# Altium footprint library Modules.PcbLib: 18 footprints (part 1 of 2)
Each footprint in its own frame and in the unit in brackets; x right, y up, seen from the top. Pads: shape width x height; smd on the part's side, far side on the other; paste and mask are expansions set on the pad; w line width, h text height; cw(c..) or ccw(c..) is an arc to the next point about the centre after c.
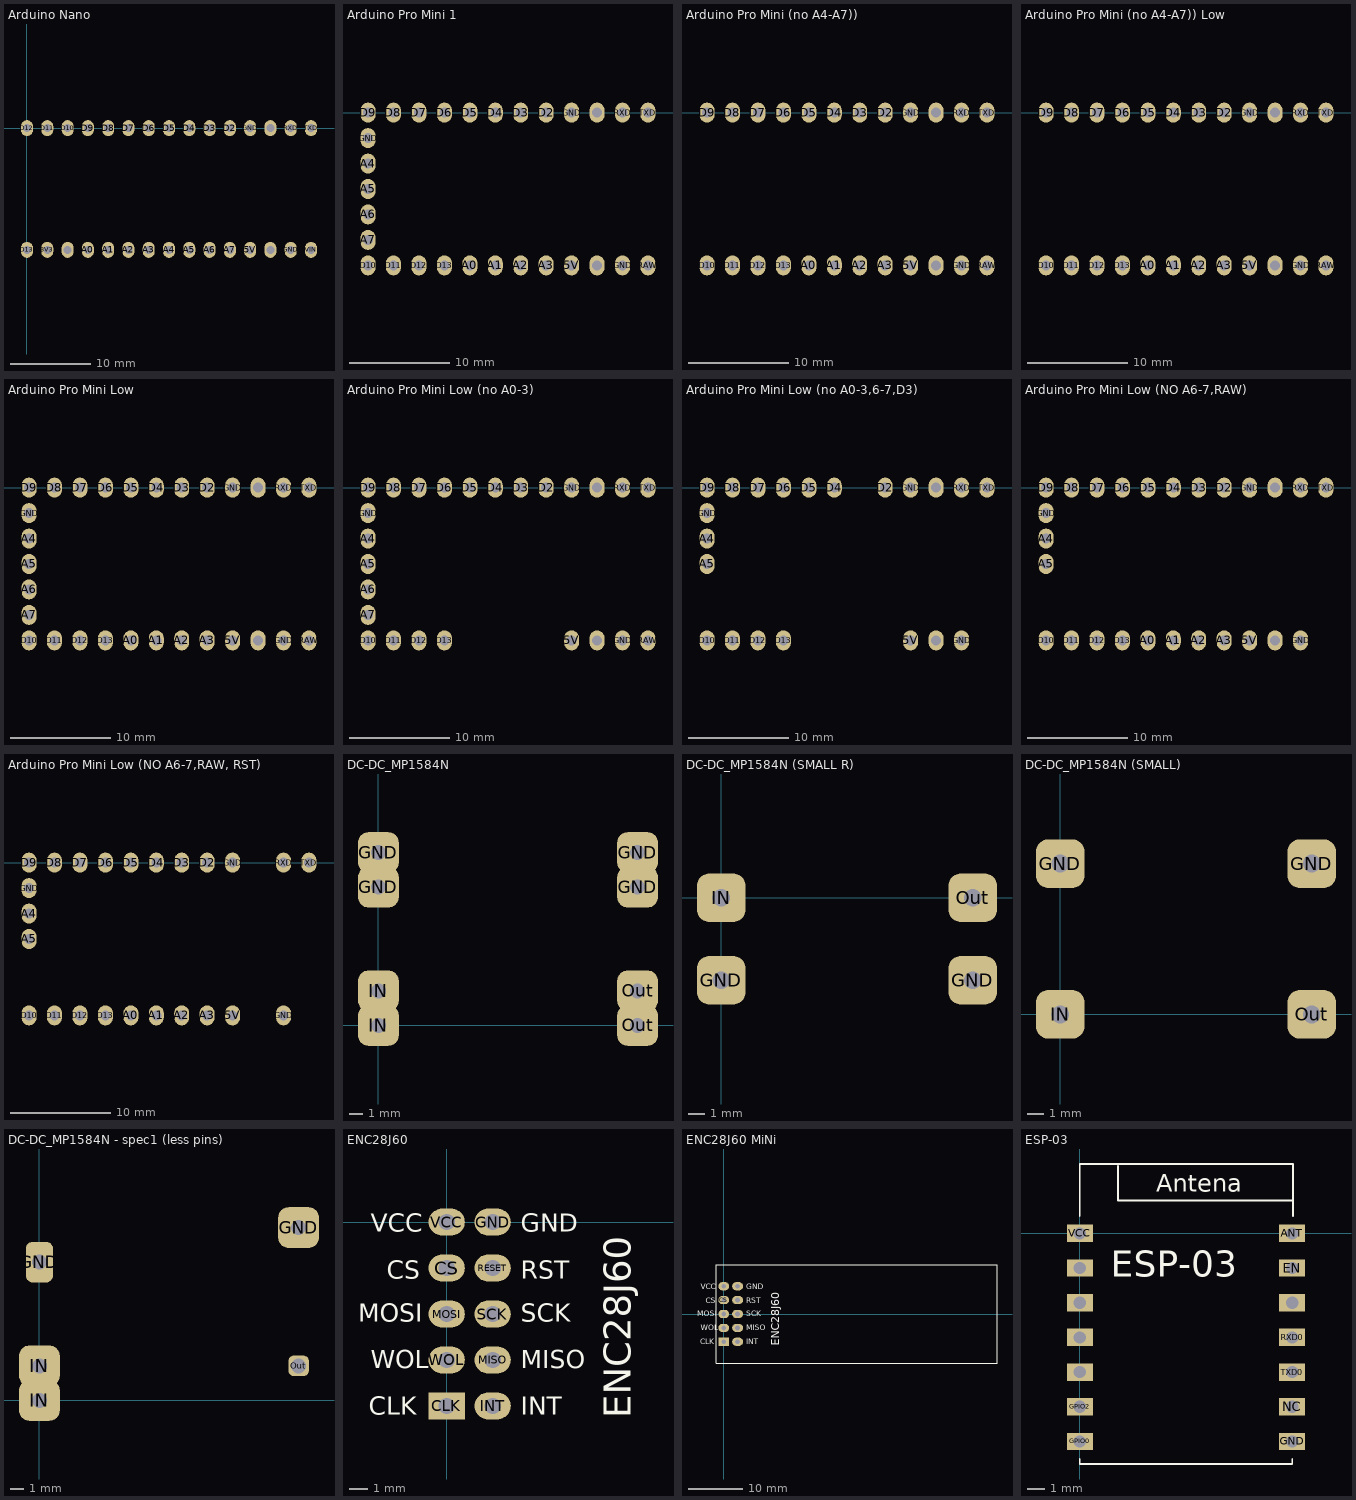
[diagram p0: the footprints below, top view; thin cyan lines are the x and y axes]

## Arduino Nano [mm]
pads (30):
  oval 1.5x2 hole 1: 3V3(2.54,-15.24) 5V(27.94,-15.24) A0(7.62,-15.24) A1(10.16,-15.24) A2(12.7,-15.24) A3(15.24,-15.24) A4(17.78,-15.24) A5(20.32,-15.24) A6(22.86,-15.24) A7(25.4,-15.24) AREF(5.08,-15.24) D2(25.4,0) D3(22.86,0) D4(20.32,0) D5(17.78,0) D6(15.24,0) D7(12.7,0) D8(10.16,0) D9(7.62,0) D10(5.08,0) D11(2.54,0) D12(0,0) D13(0,-15.24) GND(27.94,0) GND(33.02,-15.24) Reset(30.48,-15.24) Reset(30.48,0) RXD(33.02,0) TXD(35.56,0) VIN(35.56,-15.24)
3D body "Arduino Nano v3.STEP": height 21.18, standoff 2.62, extent -5.515,-16.53 39.405,1.26
3D body "PBS-10.step": height 8.4, standoff -3.2, extent -1.27,-1.27 24.13,1.27
3D body "PBS-10.step": height 8.4, standoff -3.2, extent -1.27,-16.51 24.13,-13.97
3D body "PBS-05.step": height 8.4, standoff -3.2, extent 24.13,-1.27 36.83,1.27
3D body "PBS-05.step": height 8.4, standoff -3.2, extent 24.13,-16.51 36.83,-13.97

## Arduino Pro Mini 1 [mm]
pads (29):
  oval 1.5x2 hole 1: 5V(27.94,-15.24) A0(17.78,-15.24) A1(20.32,-15.24) A2(22.86,-15.24) A3(25.4,-15.24) A4(7.62,-5.08) A5(7.62,-7.62) A6(7.62,-10.16) A7(7.62,-12.7) D2(25.4,0) D3(22.86,0) D4(20.32,0) D5(17.78,0) D6(15.24,0) D7(12.7,0) D8(10.16,0) D9(7.62,0) D10(7.62,-15.24) D11(10.16,-15.24) D12(12.7,-15.24) D13(15.24,-15.24) GND(7.62,-2.54) GND(27.94,0) GND(33.02,-15.24) RAW(35.56,-15.24) Reset(30.48,-15.24) Reset(30.48,0) RXD(33.02,0) TXD(35.56,0)
3D body "ARDUINO Pro MINI V1.STEP": height 20.8, standoff 2.2, extent 5.625,-16.925 39.625,1.675
3D body "PBS-12.step": height 8.4, standoff -3.2, extent 6.35,-1.27 36.83,1.27
3D body "PBS-12.step": height 8.4, standoff -3.2, extent 6.35,-16.51 36.83,-13.97
3D body "PBS-05.step": height 8.4, standoff -3.2, extent 6.35,-13.97 8.89,-1.27

## Arduino Pro Mini (no A4-A7)) [mm]
pads (24):
  oval 1.5x2 hole 1: 5V(27.94,-15.24) A0(17.78,-15.24) A1(20.32,-15.24) A2(22.86,-15.24) A3(25.4,-15.24) D2(25.4,0) D3(22.86,0) D4(20.32,0) D5(17.78,0) D6(15.24,0) D7(12.7,0) D8(10.16,0) D9(7.62,0) D10(7.62,-15.24) D11(10.16,-15.24) D12(12.7,-15.24) D13(15.24,-15.24) GND(27.94,0) GND(33.02,-15.24) RAW(35.56,-15.24) Reset(30.48,-15.24) Reset(30.48,0) RXD(33.02,0) TXD(35.56,0)
3D body "ARDUINO Pro MINI V1.STEP": height 20.8, standoff 2.2, extent 5.625,-16.925 39.625,1.675
3D body "PBS-12.step": height 8.4, standoff -3.2, extent 6.35,-1.27 36.83,1.27
3D body "PBS-12.step": height 8.4, standoff -3.2, extent 6.35,-16.51 36.83,-13.97

## Arduino Pro Mini (no A4-A7)) Low [mm]
pads (24):
  oval 1.5x2 hole 1: 5V(27.94,-15.24) A0(17.78,-15.24) A1(20.32,-15.24) A2(22.86,-15.24) A3(25.4,-15.24) D2(25.4,0) D3(22.86,0) D4(20.32,0) D5(17.78,0) D6(15.24,0) D7(12.7,0) D8(10.16,0) D9(7.62,0) D10(7.62,-15.24) D11(10.16,-15.24) D12(12.7,-15.24) D13(15.24,-15.24) GND(27.94,0) GND(33.02,-15.24) RAW(35.56,-15.24) Reset(30.48,-15.24) Reset(30.48,0) RXD(33.02,0) TXD(35.56,0)
3D body "ARDUINO Pro MINI V1.STEP": height 12.5, standoff -6.1, extent 5.625,-16.925 39.625,1.675

## Arduino Pro Mini Low [mm]
pads (29):
  oval 1.5x2 hole 1: 5V(27.94,-15.24) A0(17.78,-15.24) A1(20.32,-15.24) A2(22.86,-15.24) A3(25.4,-15.24) A4(7.62,-5.08) A5(7.62,-7.62) A6(7.62,-10.16) A7(7.62,-12.7) D2(25.4,0) D3(22.86,0) D4(20.32,0) D5(17.78,0) D6(15.24,0) D7(12.7,0) D8(10.16,0) D9(7.62,0) D10(7.62,-15.24) D11(10.16,-15.24) D12(12.7,-15.24) D13(15.24,-15.24) GND(7.62,-2.54) GND(27.94,0) GND(33.02,-15.24) RAW(35.56,-15.24) Reset(30.48,-15.24) Reset(30.48,0) RXD(33.02,0) TXD(35.56,0)
3D body "ARDUINO Pro MINI V1.STEP": height 12.5, standoff -6.1, extent 5.625,-16.925 39.625,1.675

## Arduino Pro Mini Low (no A0-3) [mm]
pads (25):
  oval 1.5x2 hole 1: 5V(27.94,-15.24) A4(7.62,-5.08) A5(7.62,-7.62) A6(7.62,-10.16) A7(7.62,-12.7) D2(25.4,0) D3(22.86,0) D4(20.32,0) D5(17.78,0) D6(15.24,0) D7(12.7,0) D8(10.16,0) D9(7.62,0) D10(7.62,-15.24) D11(10.16,-15.24) D12(12.7,-15.24) D13(15.24,-15.24) GND(7.62,-2.54) GND(27.94,0) GND(33.02,-15.24) RAW(35.56,-15.24) Reset(30.48,-15.24) Reset(30.48,0) RXD(33.02,0) TXD(35.56,0)
3D body "ARDUINO Pro MINI V1.STEP": height 12.5, standoff -6.1, extent 5.625,-16.925 39.625,1.675

## Arduino Pro Mini Low (no A0-3,6-7,D3) [mm]
pads (21):
  oval 1.5x2 hole 1: 5V(27.94,-15.24) A4(7.62,-5.08) A5(7.62,-7.62) D2(25.4,0) D4(20.32,0) D5(17.78,0) D6(15.24,0) D7(12.7,0) D8(10.16,0) D9(7.62,0) D10(7.62,-15.24) D11(10.16,-15.24) D12(12.7,-15.24) D13(15.24,-15.24) GND(7.62,-2.54) GND(27.94,0) GND(33.02,-15.24) Reset(30.48,-15.24) Reset(30.48,0) RXD(33.02,0) TXD(35.56,0)
3D body "ARDUINO Pro MINI V1.STEP": height 12.5, standoff -6.1, extent 5.625,-16.925 39.625,1.675

## Arduino Pro Mini Low (NO A6-7,RAW) [mm]
pads (26):
  oval 1.5x2 hole 1: 5V(27.94,-15.24) A0(17.78,-15.24) A1(20.32,-15.24) A2(22.86,-15.24) A3(25.4,-15.24) A4(7.62,-5.08) A5(7.62,-7.62) D2(25.4,0) D3(22.86,0) D4(20.32,0) D5(17.78,0) D6(15.24,0) D7(12.7,0) D8(10.16,0) D9(7.62,0) D10(7.62,-15.24) D11(10.16,-15.24) D12(12.7,-15.24) D13(15.24,-15.24) GND(7.62,-2.54) GND(27.94,0) GND(33.02,-15.24) Reset(30.48,-15.24) Reset(30.48,0) RXD(33.02,0) TXD(35.56,0)
3D body "ARDUINO Pro MINI V1.STEP": height 12.5, standoff -6.1, extent 5.625,-16.925 39.625,1.675

## Arduino Pro Mini Low (NO A6-7,RAW, RST) [mm]
pads (24):
  oval 1.5x2 hole 1: 5V(27.94,-15.24) A0(17.78,-15.24) A1(20.32,-15.24) A2(22.86,-15.24) A3(25.4,-15.24) A4(7.62,-5.08) A5(7.62,-7.62) D2(25.4,0) D3(22.86,0) D4(20.32,0) D5(17.78,0) D6(15.24,0) D7(12.7,0) D8(10.16,0) D9(7.62,0) D10(7.62,-15.24) D11(10.16,-15.24) D12(12.7,-15.24) D13(15.24,-15.24) GND(7.62,-2.54) GND(27.94,0) GND(33.02,-15.24) RXD(33.02,0) TXD(35.56,0)
3D body "ARDUINO Pro MINI V1.STEP": height 12.5, standoff -6.1, extent 5.625,-16.925 39.625,1.675

## DC-DC_MP1584N [mm]
pads (8):
  rrect50% 3x3 hole 1.1: GND(0,10.16) GND(0,12.7) GND(19.05,10.16) GND(19.05,12.7) IN(0,0) IN(0,2.54) Out(19.05,0) Out(19.05,2.54)
3D body "Resistor Adjustable SMD noname.step": height 5, standoff 3.9, extent 11.476,0.775 14.375,2.975
3D body "DO-214AC.step": height 6.4, standoff 3.83, extent 3.35,10 8.85,12.8
3D body "Inductor_5.7x5.2x3mm_SMD.step": height 6.7, standoff 3.8, extent 10.1,5.35 16,10.55
3D body "1206 SMD Capacitor.step": height 4.8, standoff 3.8, extent -0.8,4.8 0.8,8
3D body "1206 SMD Capacitor.step": height 4.8, standoff 3.8, extent 18.2,4.7 19.8,7.9
3D body "SMD 0603 (1608).step": height 4.25, standoff 3.8, extent 2.65,5.2 3.5,6.75
3D body "SMD 0603 (1608).step": height 4.25, standoff 3.8, extent 2.6,3.05 3.45,4.6
3D body "SMD 0603 (1608).step": height 4.25, standoff 3.8, extent 7.05,0.45 8.6,1.3
3D body "SMD 0603 (1608).step": height 4.25, standoff 3.8, extent 3.75,0.45 5.3,1.3
3D body "SMD 0603 (1608).step": height 4.25, standoff 3.8, extent 7.05,1.85 8.6,2.7
3D body "SMD 0603 (1608).step": height 4.25, standoff 3.8, extent 3.75,1.85 5.3,2.7
3D body "SO8.step": height 5.4, standoff 3.8, extent 3.965,3.125 8.865,9.115
3D body: height 3.8, standoff 2.3, extent -1.27,-1.27 20.303,13.97
3D body "PLS-02.stp": height 5.5, standoff -5.7, extent 17.804,-1.17 20.303,3.91
3D body "PLS-02.stp": height 5.5, standoff -5.7, extent 17.804,8.99 20.303,14.07
3D body "PLS-02.stp": height 5.5, standoff -5.7, extent -1.246,8.99 1.253,14.07
3D body "PLS-02.stp": height 5.5, standoff -5.7, extent -1.246,-1.17 1.253,3.91

## DC-DC_MP1584N (SMALL R) [mm]
pads (4):
  rrect50% 3x3 hole 1.1: GND(0,-5.08) GND(15.5,-5.08) IN(0,0) Out(15.5,0)
3D body "PLS-01R.STEP": height 11.32, standoff 0.96, extent 14.2,-4.25 16.74,1.25
3D body "PLS-01R.STEP": height 11.32, standoff 0.96, extent -1.27,-4.25 1.27,1.25
3D body "PLS-01.step": height 5.7, standoff -5.9, extent 14.23,-6.35 16.77,-3.81
3D body "PLS-01.step": height 5.7, standoff -5.9, extent -1.27,-6.35 1.27,-3.81
3D body: height 11.8, standoff 0.3, extent -1.235,-4.4 16.835,-3
3D body "SO8.step": height 10.99, standoff 5, extent 2.95,-3 7.85,-1.4
3D body "SMD 0603 (1608).step": height 3.27, standoff 1.73, extent 7.85,-3.1 8.7,-2.649
3D body "SMD 0603 (1608).step": height 3.27, standoff 1.73, extent 6.55,-3 7.4,-2.549
3D body "SMD 0603 (1608).step": height 4.57, standoff 3.03, extent 1.95,-2.9 2.8,-2.449
3D body "SMD 0603 (1608).step": height 8.77, standoff 7.22, extent 1.85,-3.1 2.7,-2.649
3D body "SMD 0603 (1608).step": height 3.27, standoff 1.73, extent 5.15,-3 6,-2.549
3D body "SMD 0603 (1608).step": height 3.27, standoff 1.73, extent 3.75,-3.1 4.6,-2.649
3D body "1206 SMD Capacitor.step": height 7.6, standoff 4.4, extent 14.7,-3 16.3,-1.998
3D body "1206 SMD Capacitor.step": height 7.6, standoff 4.4, extent -0.2,-3 1.4,-1.998
3D body "Inductor_5.7x5.2x3mm_SMD.step": height 11.1, standoff 5.2, extent 8.5,-3 13.7,-0.1
3D body "Resistor Adjustable SMD noname.step": height 4.32, standoff 1.42, extent 9.9,-2.8 12.1,-1.7

## DC-DC_MP1584N (SMALL) [mm]
pads (4):
  rrect50% 3x3 hole 1.1: GND(0,9.3) GND(15.5,9.3) IN(0,0) Out(15.5,0)
3D body "Resistor Adjustable SMD noname.step": height 5, standoff 3.9, extent 9.45,7.4 12.35,9.6
3D body "Inductor_5.7x5.2x3mm_SMD.step": height 6.7, standoff 3.8, extent 8.8,0.55 14,6.45
3D body "1206 SMD Capacitor.step": height 4.8, standoff 3.8, extent -0.6,2.9 1,6.1
3D body "1206 SMD Capacitor.step": height 4.8, standoff 3.8, extent 14.5,2.7 16.1,5.9
3D body "SMD 0603 (1608).step": height 4.25, standoff 3.8, extent 2.8,7.75 3.65,9.3
3D body "SMD 0603 (1608).step": height 4.25, standoff 3.8, extent 4.075,7.75 4.925,9.3
3D body "SMD 0603 (1608).step": height 4.25, standoff 3.8, extent 1.575,5.05 2.425,6.6
3D body "SMD 0603 (1608).step": height 4.25, standoff 3.8, extent 1.65,2.15 2.5,3.7
3D body "SMD 0603 (1608).step": height 4.25, standoff 3.8, extent 5.375,7.75 6.225,9.3
3D body "SMD 0603 (1608).step": height 4.25, standoff 3.8, extent 6.65,7.75 7.5,9.3
3D body "SO8.step": height 5.4, standoff 3.8, extent 2.815,-0.095 7.715,5.895
3D body: height 3.8, standoff 2.3, extent -1.27,-1.27 16.8,10.6
3D body "PLS-01.step": height 5.7, standoff -5.9, extent -1.27,8.03 1.27,10.57
3D body "PLS-01.step": height 5.7, standoff -5.9, extent -1.27,-1.27 1.27,1.27
3D body "PLS-01.step": height 5.7, standoff -5.9, extent 14.23,-1.27 16.77,1.27
3D body "PLS-01.step": height 5.7, standoff -5.9, extent 14.23,8.03 16.77,10.57

## DC-DC_MP1584N - spec1 (less pins) [mm]
pads (5):
  rrect50% 2x3 hole 1.1: GND(0,10.16)
  rrect50% 3x3 hole 1.1: GND(19.05,12.7) IN(0,0) IN(0,2.54)
  rrect50% 1.5x1.5 hole 1.1: Out(19.05,2.54)
3D body "PLS-02.stp": height 5.5, standoff -5.7, extent -1.246,-1.17 1.253,3.91
3D body "PLS-02.stp": height 5.5, standoff -5.7, extent -1.246,8.99 1.253,14.07
3D body "PLS-02.stp": height 5.5, standoff -5.7, extent 17.804,8.99 20.303,14.07
3D body "PLS-02.stp": height 5.5, standoff -5.7, extent 17.804,-1.17 20.303,3.91
3D body: height 3.8, standoff 2.3, extent -1.27,-1.27 20.303,13.97
3D body "SO8.step": height 5.4, standoff 3.8, extent 3.965,3.125 8.865,9.115
3D body "SMD 0603 (1608).step": height 4.25, standoff 3.8, extent 3.75,1.85 5.3,2.7
3D body "SMD 0603 (1608).step": height 4.25, standoff 3.8, extent 7.05,1.85 8.6,2.7
3D body "SMD 0603 (1608).step": height 4.25, standoff 3.8, extent 3.75,0.45 5.3,1.3
3D body "SMD 0603 (1608).step": height 4.25, standoff 3.8, extent 7.05,0.45 8.6,1.3
3D body "SMD 0603 (1608).step": height 4.25, standoff 3.8, extent 2.6,3.05 3.45,4.6
3D body "SMD 0603 (1608).step": height 4.25, standoff 3.8, extent 2.65,5.2 3.5,6.75
3D body "1206 SMD Capacitor.step": height 4.8, standoff 3.8, extent 18.2,4.7 19.8,7.9
3D body "1206 SMD Capacitor.step": height 4.8, standoff 3.8, extent -0.8,4.8 0.8,8
3D body "Inductor_5.7x5.2x3mm_SMD.step": height 6.7, standoff 3.8, extent 10.1,5.35 16,10.55
3D body "DO-214AC.step": height 6.4, standoff 3.83, extent 3.35,10 8.85,12.8
3D body "Resistor Adjustable SMD noname.step": height 5, standoff 3.9, extent 11.476,0.775 14.375,2.975

## ENC28J60 [mm]
pads (10):
  rect 2x1.5 hole 0.9: CLK(0,-10.16)
  oval 2x1.5 hole 0.9: CS(0,-2.54) GND(2.54,0) INT(2.54,-10.16) MISO(2.54,-7.62) MOSI(0,-5.08) RESET(2.54,-2.54) SCK(2.54,-5.08) VCC(0,0) WOL(0,-7.62)
Top Overlay:
  text "ENC28J60" at 10.175,-10.85 h1.5
  text "INT" at 4.1,-10.66 h1
  text "CLK" at -4.3,-10.66 h1
  text "MISO" at 4.1,-8.08 h1
  text "MOSI" at -4.9,-5.5 h1
  text "WOL" at -4.2,-8.08 h1
  text "SCK" at 4.1,-5.5 h1
  text "RST" at 4.1,-3.12 h1
  text "GND" at 4.1,-0.54 h1
  text "VCC" at -4.2,-0.54 h1
  text "CS" at -3.3,-3.12 h1
3D body "ENC28J60-Module.STEP": height 14, standoff -2.5, extent -1.5,-22.625 55.782,11.875
3D body "PBD2.54-10.step": height 8.4, standoff -2.7, extent -1.265,-11.425 3.815,1.275

## ENC28J60 MiNi [mm]
pads (10):
  rect 2x1.5 hole 0.9: CLK(0,-5.08)
  oval 2x1.5 hole 0.9: CS(0,2.54) GND(2.54,5.08) INT(2.54,-5.08) MISO(2.54,-2.54) MOSI(0,0) RESET(2.54,2.54) SCK(2.54,0) VCC(0,5.08) WOL(0,-2.54)
Top Overlay:
  lines w0.2: -1.35,-9 -1.35,9 50,9 50,-9 -1.35,-9
  text "ENC28J60" at 10.175,-5.77 h1.5
  text "INT" at 4.1,-5.58 h1
  text "CLK" at -4.3,-5.58 h1
  text "MISO" at 4.1,-3 h1
  text "MOSI" at -4.9,-0.42 h1
  text "WOL" at -4.2,-3 h1
  text "SCK" at 4.1,-0.42 h1
  text "RST" at 4.1,1.96 h1
  text "GND" at 4.1,4.54 h1
  text "VCC" at -4.2,4.54 h1
  text "CS" at -3.3,1.96 h1
3D body "LED 0805 Red.step": height 13.7, standoff 12.6, extent 3.99,-3.75 6.01,-2.5
3D body "SMD 0805 (2012).step": height 13.05, standoff 12.6, extent 4,3.75 6,5
3D body "SMD 0805 (2012).step": height 13.05, standoff 12.6, extent 4,-1.25 6,0
3D body "SMD 0805 (2012).step": height 13.05, standoff 12.6, extent 4,-6.25 6,-5
3D body "SMD 0805 (2012).step": height 13.05, standoff 12.6, extent 26.5,-6.25 28.5,-5
3D body "SMD 0805 (2012).step": height 13.05, standoff 12.6, extent 26.5,-3.75 28.5,-2.5
3D body "SMD 0805 (2012).step": height 13.05, standoff 12.6, extent 26.5,-1.25 28.5,0
3D body "SMD 0805 (2012).step": height 13.05, standoff 12.6, extent 26.5,1.25 28.5,2.5
3D body "SMD 0805 (2012).step": height 13.05, standoff 12.6, extent 26.5,3.75 28.5,5
3D body "LED 0805 Red.step": height 13.7, standoff 12.6, extent 3.99,1.25 6.01,2.5
3D body "SMD 0805 (2012).step": height 13.05, standoff 12.6, extent 26.5,6.25 28.5,7.5
3D body "SO28.step": height 11.25, standoff 8.61, extent 7.66,-5 25.74,5.67
3D body "pin_header_awl254-dg-g10d.stp": height 14, standoff 2.5, extent -1.265,-6.345 3.815,6.355
3D body: height 12.7, standoff 11.1, extent -1.3,-9 50,9
3D body "RJ45 - HR911105A.step": height 14.1, standoff -2.4, extent 28.5,-7.9 49.9,7.98
3D body "PBD2.54-10.step": height 8.4, standoff -2.7, extent -1.265,-6.345 3.815,6.355

## ESP-03 [mm]
height 2.5
pads (14):
  rect 1.5x1 hole 0.7: ANT(12.25,0) EN(12.25,-2) GND(12.25,-12) GPIO0(0,-12) GPIO2(0,-10) GPIO12(0,-4) GPIO13(0,-6) GPIO14(0,-2) GPIO15(0,-8) GPIO16(12.25,-4) NC(12.25,-10) RXD0(12.25,-6) TXD0(12.25,-8) VCC(0,0)
Top Overlay:
  lines w0.1: 0,-13 0,-13.3 12.25,-13.3 12.25,-13 ; 0,1 0,4 12.3,4 12.3,1 ; 2.2,3.9 2.2,1.9 12.3,1.9
  text "ESP-03" at 1.8,-2.5 h1.52
  text "Antena" at 4.4,2.4 h1
3D body "ESP8266_ESP-03.step": height 3.44, standoff 0, extent 0,-13.25 12.3,4.05